# Altium footprint library AHMET_CAN_KARACAN.PcbL.PcbLib: 65 footprints (part 4 of 5)
Each footprint in its own frame and in the unit in brackets; x right, y up, seen from the top. Pads: shape width x height; smd on the part's side, far side on the other; paste and mask are expansions set on the pad; w line width, h text height; cw(c..) or ccw(c..) is an arc to the next point about the centre after c.
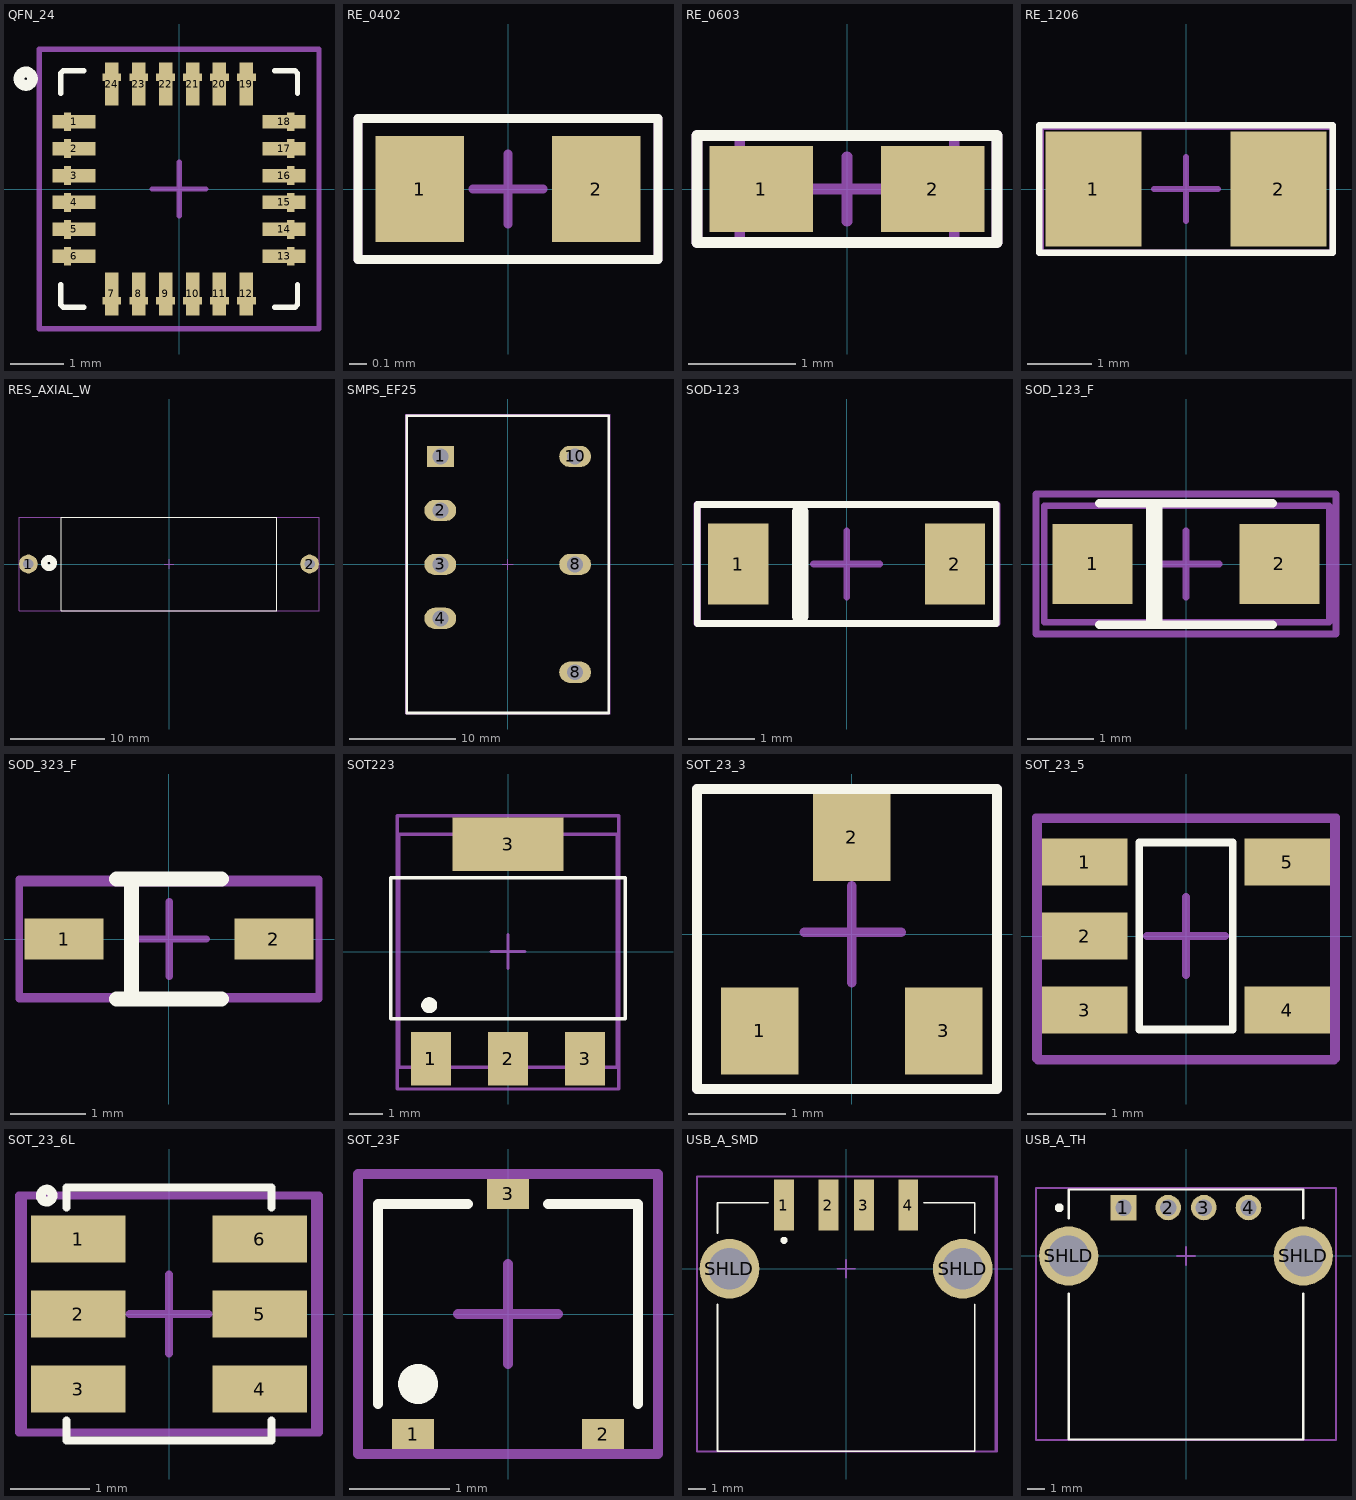
[diagram p3: the footprints below, top view; thin cyan lines are the x and y axes]

## QFN_24 [mm] "PQFN, 24-Leads, Body 4,00x4,00mm, Pitch 0,50mm, Thermal Pad 4,00x2,70mm, IPC Medium Density"
height 0.9
pads (48):
  rect 0x0.35 smd: 1(-2.075,1.25) 2(-2.075,0.75) 3(-2.075,0.25) 4(-2.075,-0.25) 5(-2.075,-0.75) 6(-2.075,-1.25) 13(2.075,-1.25) 14(2.075,-0.75) 15(2.075,-0.25) 16(2.075,0.25) 17(2.075,0.75) 18(2.075,1.25)
  rect 0.8x0.25 smd mask+0.05: 1(-1.95,1.25) 2(-1.95,0.75) 3(-1.95,0.25) 4(-1.95,-0.25) 5(-1.95,-0.75) 6(-1.95,-1.25) 13(1.95,-1.25) 14(1.95,-0.75) 15(1.95,-0.25) 16(1.95,0.25) 17(1.95,0.75) 18(1.95,1.25)
  rect 0.35x0 smd: 7(-1.25,-2.075) 8(-0.75,-2.075) 9(-0.25,-2.075) 10(0.25,-2.075) 11(0.75,-2.075) 12(1.25,-2.075) 19(1.25,2.075) 20(0.75,2.075) 21(0.25,2.075) 22(-0.25,2.075) 23(-0.75,2.075) 24(-1.25,2.075)
  rect 0.25x0.8 smd mask+0.05: 7(-1.25,-1.95) 8(-0.75,-1.95) 9(-0.25,-1.95) 10(0.25,-1.95) 11(0.75,-1.95) 12(1.25,-1.95) 19(1.25,1.95) 20(0.75,1.95) 21(0.25,1.95) 22(-0.25,1.95) 23(-0.75,1.95) 24(-1.25,1.95)
Top Overlay:
  circle w0.2: c-2.85,2.05 r0.125
  lines w0.1: -2.2,-1.775 -2.2,-2.15 -2.15,-2.2 -1.775,-2.2 ; -2.2,1.775 -2.2,2.15 -2.15,2.2 -1.775,2.2 ; 1.775,-2.2 2.15,-2.2 2.2,-2.15 2.2,-1.775 ; 1.775,2.2 2.15,2.2 2.2,2.15 2.2,1.775
Top Component Center:
  lines w0.1: -0.5,0 0.5,0 ; 0,-0.5 0,0.5 ; -2.6,-2.6 -2.6,2.6 2.6,2.6 2.6,-2.6 -2.6,-2.6
Top Designator:
  lines w0.1: -2.6,-2.6 2.6,-2.6 2.6,2.6 -2.6,2.6 -2.6,-2.6
  text ".Designator" at -1.05,-0.417 h1
3D body "QFN_24.step": height 0.9, standoff 0, extent -2.05,-2.05 2.05,2.05

## RE_0402 [mm]
pads (2):
  rect 0.5x0.6 smd mask+0.05: 1(-0.5,0) 2(0.5,0)
Top Overlay:
  lines w0.05: -0.85,-0.4 -0.85,0.4 0.85,0.4 0.85,-0.4 -0.85,-0.4
Top Component Center:
  lines w0.05: -0.2,0 0.2,0 ; 0,-0.2 0,0.2 ; -0.85,-0.4 -0.85,0.4 0.85,0.4 0.85,-0.4 -0.85,-0.4
Top Designator:
  lines w0.05: -0.85,-0.4 -0.85,0.4 0.85,0.4 0.85,-0.4 -0.85,-0.4
  text ".Designator" at -0.6,-0.258 h0.5
3D body "RES_0402.STEP": height 0.4, standoff 0, extent -0.5,-0.25 0.5,0.25

## RE_0603 [mm]
pads (2):
  rect 0.965x0.8 smd mask+0.05: 1(-0.8,0) 2(0.8,0)
Top Overlay:
  lines w0.1: -1.4,-0.5 -1.4,0.5 -1.3,0.5 1.4,0.5 1.4,-0.5 -1.4,-0.5
Top 3D Body:
  lines w0.1: -1,-0.5 -1,0.5 1,0.5 1,-0.5 -1,-0.5
Top Component Center:
  lines w0.1: -0.3,0 0.3,0 ; 0,-0.3 0,0.3 ; -1.4,-0.5 1.4,-0.5 1.4,0.5 -1.4,0.5 -1.4,-0.5
Top Designator:
  lines w0.1: -1.4,-0.5 -1.4,0.5 1.4,0.5 1.4,-0.5 -1.4,-0.5
  text ".Designator" at -0.2,-0.167 h0.4
3D body "res0603S1.STEP": height 0.45, standoff 0, extent -0.988,-0.5 0.988,0.479

## RE_1206 [mm]
pads (2):
  rect 1.5x1.8 smd mask+0.05: 1(-1.45,0) 2(1.45,0)
Top Overlay:
  lines w0.1: -2.3,-1 2.3,-1 2.3,1 -2.3,1 -2.3,-1
Top Component Center:
  lines w0.1: -0.5,0 0.5,0 ; 0,-0.5 0,0.5 ; -2.275,-1 2.3,-1 2.3,0.975 -2.275,0.975 -2.275,-1
Top Designator:
  lines w0.1: -2.3,-1 2.3,-1 2.3,1 -2.3,1 -2.3,-1
  text ".Designator" at -0.4,-0.133 h0.5
3D body "res1206r.STEP": height 0.55, standoff 0, extent -1.934,-0.938 2.034,0.938

## RES_AXIAL_W [mm]
pads (2):
  round 2 hole 1.1 mask+0.05: 1(-15,0) 2(15,0)
Top Overlay:
  circle w0.7: c-12.8,0.1 r0.5
  lines w0.1: -11.5,-5 -11.5,5 11.5,5 11.5,-5 -11.5,-5
Top Component Center:
  lines w0.1: -0.5,0 0.5,0 ; 0,-0.5 0,0.5 ; -16,-5 -16,5 16,5 16,-5 -16,-5
Top Designator:
  lines w0.1: -16,-5 16,-5 16,5 -16,5 -16,-5
  text ".Designator" at -1.746,-0.738 h1.52
3D body: height 5, standoff -4, extent -15.4,-0.315 -14.6,0.485
3D body: height 5, standoff 4.2, extent -15.3,-0.4 -6.3,0.4
3D body: height 5, standoff -4, extent 14.6,-0.485 15.4,0.315
3D body: height 5, standoff 4.2, extent 6.3,-0.4 15.3,0.4
3D body: height 9.65, standoff 0, extent -11,-4.825 11,4.825

## SMPS_EF25 [mm]
pads (7):
  rect 2.54x2 hole 1.5: 1(-6.35,10.16)
  oval 3x2 hole 1.5: 2(-6.35,5.08) 3(-6.35,0) 4(-6.35,-5.08) 8(6.35,-10.16) 8(6.35,0) 10(6.35,10.16)
Top Overlay:
  lines w0.25: -9.5,-14 -9.5,14 ; 9.5,-14 9.5,14
  lines w0.254: -9.5,-14 9.5,-14 ; -9.5,14 9.5,14
  text "." at -2.428,9.787 h10
Top Component Center:
  lines w0.1: -0.5,0 0.5,0 ; 0,-0.5 0,0.5 ; -9.6,-14.09 9.65,-14.09 9.65,14.16 -9.6,14.16 -9.6,-14.09
Top Designator:
  lines w0.1: -9.55,-14.05 -9.55,14 9.525,14 9.525,-14.05 -9.55,-14.05
  text ".Designator" at -0.85,-0.258 h0.8
3D body "User Library-Trafo EE25.step": height 32.35, standoff -3.5, extent -9.025,-12.573 8.975,12.827

## SOD-123 [mm]
pads (2):
  rect 0.91x1.22 smd: 1(-1.637,0) 2(1.637,0)
Top Overlay:
  lines w0.1: -2.257,-0.9 -2.257,0.9 2.262,0.9 2.262,-0.9 -2.257,-0.9
  lines w0.25: -0.699,-0.787 -0.699,0.787
Top Component Center:
  lines w0.1: -0.5,0 0.5,0 ; 0,-0.5 0,0.5 ; -2.262,-0.9 -2.262,0.9 2.262,0.9 2.262,-0.9 -2.262,-0.9
Top Designator:
  lines w0.1: -2.25,-0.9 -2.25,0.9 2.275,0.9 2.275,-0.9 -2.25,-0.9
  text ".Designator" at -0.525,-0.183 h0.5
3D body "SOD123.STEP": height 1.42, standoff -0.03, extent -1.938,-0.85 1.912,0.85

## SOD_123_F [mm]
pads (2):
  rect 1.2x1.2 smd paste-0.05: 1(-1.4,0) 2(1.4,0)
Top Overlay:
  lines w0.1: -0.6,-0.9 -0.5,-0.9 ; -0.6,0.9 -0.4,0.9
  lines w0.127: -1.3,-0.913 1.3,-0.913 ; -1.3,0.914 1.3,0.914
  lines w0.25: -0.478,-0.833 -0.478,0.832
Top Component Center:
  lines w0.1: -0.5,0 0.5,0 ; 0,-0.5 0,0.5 ; -2.125,-0.875 2.15,-0.875 2.15,0.875 -2.125,0.875 -2.125,-0.875
Top Designator:
  lines w0.1: -2.25,-1.05 2.25,-1.05 2.25,1.05 -2.25,1.05 -2.25,-1.05
  text ".Designator" at -0.75,-0.483 h0.8
3D body "step_temp.STEP": height 1.2, standoff 0, extent -1.75,-0.8 1.75,0.8

## SOD_323_F [mm]
pads (2):
  rect 1.05x0.55 smd mask+0.05: 1(-1.4,0) 2(1.4,0)
Top Overlay:
  rectangle: -0.6,-0.8 -0.4,0.8
  lines w0.2: -0.7,-0.8 0.7,-0.8 ; -0.7,0.8 0.7,0.8
Top Component Center:
  lines w0.1: -0.5,0 0.5,0 ; 0,-0.5 0,0.5 ; -2,-0.77 -2,0.75 2,0.75 2,0.21 2,-0.77 -2,-0.77
Top Designator:
  lines w0.1: -2,-0.8 -2,0.8 2,0.8 2,-0.8 -2,-0.8
  text ".Designator" at -0.775,-0.208 h0.5
3D body "SOD-323F.STEP": height 0.79, standoff -0.08, extent -1.35,-0.68 1.35,0.67

## SOT223 [mm]
pads (5):
  rect 1.2x1.6 smd mask+0.05: 1(-2.3,-3.2) 1(-2.3,-3.2) 2(0,-3.2) 3(2.3,-3.2)
  rect 3.3x1.6 smd mask+0.05: 3(0,3.2)
Top Overlay:
  circle w0.254: c-2.35,-1.6 r0.112
  lines w0.1: -3.5,-2 3.5,-2 3.5,2.2 -3.5,2.2 -3.5,-2
Top 3D Body:
  lines w0.1: -3.25,-3.45 -3.25,3.5 3.25,3.5 3.25,-3.45 -3.25,-3.45
Top Component Center:
  lines w0.1: -0.5,0 0.5,0 ; 0,-0.5 0,0.5 ; -3.3,-4.1 3.3,-4.1 3.3,4.05 -3.3,4.05 -3.3,-4.1
Top Designator:
  lines w0.1: -3.3,-4.1 -3.3,4.05 3.3,4.05 3.3,-4.1 -3.3,-4.1
  text ".Designator" at -0.746,-0.163 h1.15
3D body "SOT223.STEP": height 1.8, standoff 0, extent -3.25,-3.499 3.25,3.499

## SOT_23_3 [mm]
pads (3):
  rect 0.8x0.9 smd mask+0.05: 1(-0.95,-1) 2(0,1) 3(0.95,-1)
Top Overlay:
  lines w0.1: -1.6,-1.6 -1.6,1.5 1.5,1.5 1.5,-1.6 -1.6,-1.6
Top Component Center:
  lines w0.1: -0.49,0.021 0.51,0.021 ; 0,-0.5 0,0.5 ; -1.6,-1.6 1.5,-1.6 1.5,1.5 -1.5,1.5 -1.6,1.5 -1.6,-1.6
Top Designator:
  lines w0.1: -1.6,-1.6 -1.6,1.5 1.5,1.5 1.5,-1.6 -1.6,-1.6
  text ".Designator" at -0.6,-0.233 h0.5
3D body "SOT_23_3.step": height 0.95, standoff -0.07, extent -1.46,-1.25 1.46,1.226

## SOT_23_5 [mm]
pads (5):
  rect 1.1x0.6 smd mask+0.05: 1(-1.3,0.95) 2(-1.3,0) 3(-1.3,-0.95) 4(1.3,-0.95) 5(1.3,0.95)
Top Overlay:
  lines w0.1: -0.6,-1.2 0.6,-1.2 0.6,1.2 -0.1,1.2 -0.6,1.2 -0.6,0.7 -0.6,-1.2
Top Component Center:
  lines w0.1: -0.5,0 0.5,0 ; 0,-0.5 0,0.5 ; -1.925,-1.575 1.925,-1.575 1.925,1.525 -1.925,1.525 -1.925,-1.575
Top Designator:
  lines w0.1: -1.9,-1.6 1.9,-1.6 1.9,1.5 -1.9,1.5 -1.9,-1.6
  text ".Designator" at -0.75,-0.283 h0.8
3D body "SOT_23_5.stp": height 1, standoff 0, extent -1.2,-1.45 1.2,1.45

## SOT_23_6L [mm]
pads (6):
  rect 1.2x0.6 smd mask+0.05: 1(-1.15,0.95) 2(-1.15,0) 3(-1.15,-0.95) 4(1.15,-0.95) 5(1.15,0) 6(1.15,0.95)
Top Overlay:
  circle w0.125: c-1.55,1.5 r0.075
  lines w0.1: -1.3,-1.35 -1.3,-1.6 1.3,-1.6 1.3,-1.35 ; -1.3,1.35 -1.3,1.6 1.3,1.6 1.3,1.35
Top Component Center:
  lines w0.1: -0.5,0 0.5,0 ; 0,-0.5 0,0.5 ; -1.85,-1.5 -1.85,1.5 1.85,1.5 1.85,-1.5 -1.85,-1.5
Top Designator:
  lines w0.1: -1.9,-1.5 -1.9,1.5 1.9,1.5 1.9,-1.5 -1.9,-1.5
  text ".Designator" at -0.4,-0.183 h0.5
3D body "SOT_23_6.stp": height 1, standoff 0, extent -1.2,-1.45 1.2,1.45

## SOT_23F [mm]
pads (3):
  rect 0.42x0.3 smd mask+0.05: 1(-0.95,-1.2) 2(0.95,-1.2) 3(0,1.2)
Top Overlay:
  circle w0.2: c-0.9,-0.7 r0.1
  lines w0.1: -1.3,-0.9 -1.3,1.1 -0.4,1.1 ; 0.4,1.1 1.3,1.1 1.3,-0.9
Top Component Center:
  lines w0.1: -0.5,0 0.5,0 ; 0,-0.5 0,0.5 ; -1.5,-1.4 1.5,-1.4 1.5,1.4 -1.5,1.4 -1.5,-1.3 -1.5,-1.4
Top Designator:
  lines w0.1: -1.5,-1.4 1.5,-1.4 1.5,1.4 -1.5,1.4 -1.5,-1.4
  text ".Designator" at -0.95,-0.317 h1
3D body "SOT23F-1.STEP": height 0.91, standoff 0, extent -1.45,-1.2 1.45,1.2

## USB_A_SMD [mm]
pads (6):
  rect 1.12x2.88 smd mask+0.05: 1(-3.5,3.58) 2(-1,3.58) 3(1,3.58) 4(3.5,3.58)
  round 3.376 hole 2.36 mask+0.05: SHLD(-6.57,0) SHLD(6.57,0)
Top Overlay:
  circle w0.2: c-3.5,1.6 r0.1
  lines w0.1: -7.25,-2.008 -7.25,-10.28 7.25,-10.28 7.25,-2.008 ; -7.25,2.008 -7.25,3.72 -4.38,3.72 ; 4.38,3.72 7.25,3.72 7.25,2.008
Top Component Center:
  lines w0.1: -0.5,0 0.5,0 ; 0,-0.5 0,0.5 ; -8.4,-10.3 8.4,-10.3 8.4,5.2 -8.4,5.2 -8.4,0.1 -8.4,-10.3
Top Designator:
  lines w0.1: -8.4,-10.3 -8.4,5.2 8.5,5.2 8.5,-10.3 -8.4,-10.3
  text ".Designator" at -0.95,-0.417 h1
3D body "step_temp.STEP": height 7.74, standoff -2.63, extent -7.25,-10.3 7.25,4.583

## USB_A_TH [mm]
pads (6):
  rect 1.428x1.428 / inner round 1.428 / far side rect 1.428x1.428 hole 0.92: 1(-3.5,2.71)
  round 1.428 hole 0.92: 2(-1,2.71) 3(1,2.71) 4(3.5,2.71)
  round 3.316 hole 2.3: SHLD(-6.57,0) SHLD(6.57,0)
Top Overlay:
  circle w0.3: c-7.1,2.7 r0.1
  lines w0.127: -6.565,-2.1 -6.565,-10.28 6.565,-10.28 6.565,-2.1 ; -6.565,2.1 -6.565,3.72 6.565,3.72 6.565,2.1
Top Component Center:
  lines w0.1: -0.5,0 0.5,0 ; 0,-0.5 0,0.5 ; -8.4,-10.3 8.4,-10.3 8.4,3.8 -8.4,3.8 -8.4,-10.3
Top Designator:
  lines w0.1: -8.4,-10.3 8.4,-10.3 8.4,3.8 -8.4,3.8 -8.4,0.1 -8.4,-10.3
  text ".Designator" at -0.95,-0.417 h1
3D body "USB_A.stp": height 7.62, standoff -3.23, extent -7.315,-10.3 7.315,3.7